# Altium footprint library Connectors_Old.PcbLib: 246 footprints (part 11 of 18)
Each footprint in its own frame and in the unit in brackets; x right, y up, seen from the top. Pads: shape width x height; smd on the part's side, far side on the other; paste and mask are expansions set on the pad; w line width, h text height; cw(c..) or ccw(c..) is an arc to the next point about the centre after c.
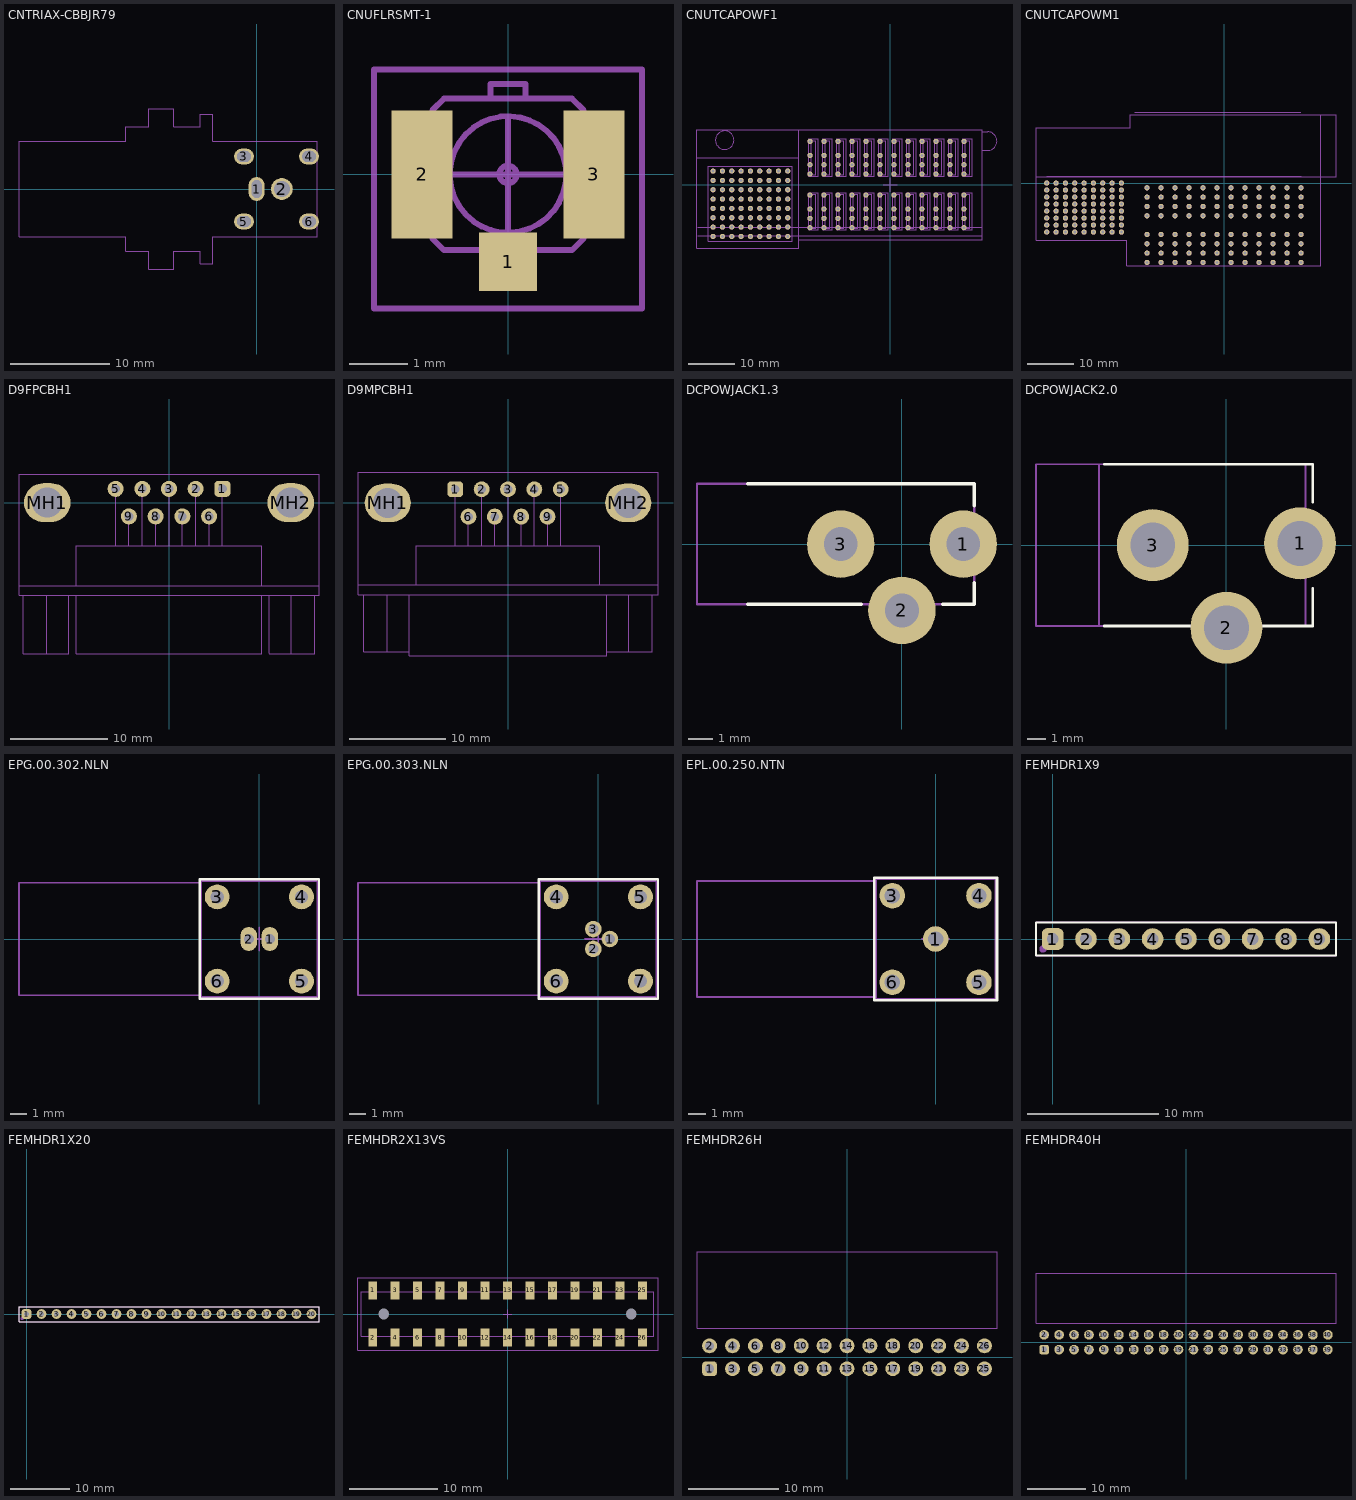
[diagram p10: the footprints below, top view; thin cyan lines are the x and y axes]

## CNTRIAX-CBBJR79 [mm] "Triax/Twinax Right Angle connector"
height 14.351
pads (6):
  oval 1.6x2.4 hole 1 slot 1.8 at 90 deg: 1(0,0)
  round 2.2 hole 1.6: 2(2.54,0)
  oval 2x1.6 hole 1.1 slot 1.4 at 0 deg: 3(-1.27,3.277) 4(5.283,3.277) 5(-1.27,-3.277) 6(5.283,-3.277)
Mechanical 13:
  lines w0.102: -23.927,-4.807 -23.927,4.807 -13.17,4.807 -13.17,6.25 -10.884,6.25 -10.884,8.1 -8.344,8.1 -8.344,6.25 -5.69,6.25 -5.69,7.54 -4.42,7.54 -4.42,4.805 6.096,4.805 6.096,-4.805 -4.42,-4.805 -4.42,-7.54 -5.69,-7.54 -5.69,-6.25 -8.344,-6.25 -8.344,-8.1 -10.884,-8.1 -10.884,-6.25 -13.17,-6.25 -13.17,-4.807 -23.927,-4.807
3D body: height 0.76, standoff 0, extent -2.032,-4.064 6.096,4.064
3D body: height 10.89, standoff 1.3, extent -4.42,-4.805 6.096,4.767
3D body: height 13.62, standoff -1.43, extent -5.69,-7.481 -4.42,7.54
3D body: height 12.33, standoff -0.14, extent -8.344,-6.25 -5.69,6.201
3D body: height 14.18, standoff -1.99, extent -10.884,-8.036 -8.344,8.1
3D body: height 12.33, standoff -0.14, extent -13.17,-6.201 -10.884,6.25
3D body: height 10.91, standoff 1.28, extent -23.927,-4.807 -13.17,4.807
3D body: height 0, standoff -3.3, extent -1.905,3.175 -0.635,3.81
3D body: height 0, standoff -3.3, extent 4.648,3.175 5.918,3.81
3D body: height 0, standoff -3.3, extent -1.905,-3.81 -0.635,-3.175
3D body: height 0, standoff -3.3, extent 4.648,-3.81 5.918,-3.175
3D body: height 0, standoff -3.3, extent -0.35,-0.7 0.35,0.7
3D body: height 0, standoff -3.6, extent 1.875,-0.722 3.269,0.675

## CNUFLRSMT-1 [mm] "ultra small RF connector 3x3.1mm"
height 2.4
pads (3):
  rect 1x1 smd: 1(0,-1.5)
  rect 1.05x2.2 smd: 2(-1.475,0) 3(1.475,0)
Mechanical 13:
  circle w0.1: c0,0 r1
  circle w0.1: c0,0 r0.15
  lines w0.102: -1.3,-0.9 -1.5,-0.9 -1.5,0.9 -1.3,0.9 ; -0.3,-1.3 -0.3,-1.55 0.3,-1.55 0.3,-1.3 ; -0.3,1.3 -0.3,1.55 0.3,1.55 0.3,1.3 ; 1.3,-0.9 1.5,-0.9 1.5,0.9 1.3,0.9 ; -1.3,-1.1 -1.3,1.1 -1.1,1.3 1.1,1.3 1.3,1.1 1.3,-1.1 1.1,-1.3 -1.1,-1.3 -1.3,-1.1
Mechanical 15:
  lines w0.1: -1,0 1,0 ; 0,-1 0,1 ; -2.3,-2.3 -2.3,1.8 2.3,1.8 2.3,-2.3 -2.3,-2.3
3D body: height 1.25, standoff 0.35, extent -1.009,-1.009 1.009,1.009
3D body: height 0.35, standoff 0, extent -1.3,-1.3 1.3,1.3

## CNUTCAPOWF1 [mm] "uTCA Power connector female for backplane"
pads (168):
  round 1.1 hole 0.6: A1(-22,-11.12) A2(-24,-11.12) A3(-26,-11.12) A4(-28,-11.12) A5(-30,-11.12) A6(-32,-11.12) A7(-34,-11.12) A8(-36,-11.12) A9(-38,-11.12) B1(-22,-9.12) B2(-24,-9.12) B3(-26,-9.12) B4(-28,-9.12) B5(-30,-9.12) B6(-32,-9.12) B7(-34,-9.12) B8(-36,-9.12) B9(-38,-9.12) C1(-22,-7.12) C2(-24,-7.12) C3(-26,-7.12) C4(-28,-7.12) C5(-30,-7.12) C6(-32,-7.12) C7(-34,-7.12) C8(-36,-7.12) C9(-38,-7.12) D1(-22,-5.12) D2(-24,-5.12) D3(-26,-5.12) D4(-28,-5.12) D5(-30,-5.12) D6(-32,-5.12) D7(-34,-5.12) D8(-36,-5.12) D9(-38,-5.12) E1(-22,-3.12) E2(-24,-3.12) E3(-26,-3.12) E4(-28,-3.12) E5(-30,-3.12) E6(-32,-3.12) E7(-34,-3.12) E8(-36,-3.12) E9(-38,-3.12) F1(-22,-1.12) F2(-24,-1.12) F3(-26,-1.12) F4(-28,-1.12) F5(-30,-1.12) F6(-32,-1.12) F7(-34,-1.12) F8(-36,-1.12) F9(-38,-1.12) G1(-22,0.88) G2(-24,0.88) G3(-26,0.88) G4(-28,0.88) G5(-30,0.88) G6(-32,0.88) G7(-34,0.88) G8(-36,0.88) G9(-38,0.88) H1(-22,2.88) H2(-24,2.88) H3(-26,2.88) H4(-28,2.88) H5(-30,2.88) H6(-32,2.88) H7(-34,2.88) H8(-36,2.88) H9(-38,2.88) P1(15.75,-9.25) P1(15.75,-7.25) P1(15.75,-5.25) P1(15.75,-2.25) P2(12.75,-9.25) P2(12.75,-7.25) P2(12.75,-5.25) P2(12.75,-2.25) P3(9.75,-9.25) P3(9.75,-7.25) P3(9.75,-5.25) P3(9.75,-2.25) P4(6.75,-9.25) P4(6.75,-7.25) P4(6.75,-5.25) P4(6.75,-2.25) P5(3.75,-9.25) P5(3.75,-7.25) P5(3.75,-5.25) P5(3.75,-2.25) P6(0.75,-9.25) P6(0.75,-7.25) P6(0.75,-5.25) P6(0.75,-2.25) P7(-2.25,-9.25) P7(-2.25,-7.25) P7(-2.25,-5.25) P7(-2.25,-2.25) P8(-5.25,-9.25) P8(-5.25,-7.25) P8(-5.25,-5.25) P8(-5.25,-2.25) P9(-8.25,-9.25) P9(-8.25,-7.25) P9(-8.25,-5.25) P9(-8.25,-2.25) P10(-11.25,-9.25) P10(-11.25,-7.25) P10(-11.25,-5.25) P10(-11.25,-2.25) P11(-14.25,-9.25) P11(-14.25,-7.25) P11(-14.25,-5.25) P11(-14.25,-2.25) P12(-17.25,-9.25) P12(-17.25,-7.25) P12(-17.25,-5.25) P12(-17.25,-2.25) P13(15.75,2.25) P13(15.75,4.25) P13(15.775,6.25) P13(15.775,9.25) P14(12.75,2.25) P14(12.75,4.25) P14(12.775,6.25) P14(12.775,9.25) P15(9.75,2.25) P15(9.75,4.25) P15(9.775,6.25) P15(9.775,9.25) P16(6.75,2.25) P16(6.75,4.25) P16(6.775,6.25) P16(6.775,9.25) P17(3.75,2.25) P17(3.75,4.25) P17(3.775,6.25) P17(3.775,9.25) P18(0.75,2.25) P18(0.75,4.25) P18(0.775,6.25) P18(0.775,9.25) P19(-2.25,2.25) P19(-2.25,4.25) P19(-2.225,6.25) P19(-2.225,9.25) P20(-5.25,2.25) P20(-5.25,4.25) P20(-5.225,6.25) P20(-5.225,9.25) P21(-8.25,2.25) P21(-8.25,4.25) P21(-8.225,6.25) P21(-8.225,9.25) P22(-11.25,2.25) P22(-11.25,4.25) P22(-11.225,6.25) P22(-11.225,9.25) P23(-14.25,2.25) P23(-14.25,4.25) P23(-14.225,6.25) P23(-14.225,9.25) P24(-17.25,2.25) P24(-17.25,4.25) P24(-17.225,6.25) P24(-17.225,9.25)
Mechanical 13:
  drawing of 208 lines, arcs and shapes, not listed
Mechanical 15:
  lines w0.1: -41.25,-11 19.5,-11 ; -41.25,-9.12 19.5,-9.12 ; -1.5,0 1.5,0 ; 0,-1.5 0,1.5
  text "EDGE DAUGHTER PCB" at -20.75,-10.52 h1
Mechanical 17:
  drawing of 168 lines, arcs and shapes, not listed
  text "Finished hole: 0.6 ± 0.05 mm" at -38.608,10.922 h2.5
  text "Drilled hole: 0.7 ± 0.02 mm" at -38.608,12.954 h2.5
3D body: height 10, standoff -3.7, extent -38.252,-11.333 -37.744,-10.901
3D body: height 10, standoff -3.7, extent -36.252,-11.333 -35.744,-10.901
3D body: height 10, standoff -3.7, extent -34.252,-11.333 -33.744,-10.901
3D body: height 10, standoff -3.7, extent -32.252,-11.333 -31.744,-10.901
3D body: height 10, standoff -3.7, extent -30.252,-11.333 -29.744,-10.901
3D body: height 10, standoff -3.7, extent -28.252,-11.333 -27.744,-10.901
3D body: height 10, standoff -3.7, extent -26.252,-11.333 -25.744,-10.901
3D body: height 10, standoff -3.7, extent -24.252,-11.333 -23.744,-10.901
3D body: height 10, standoff -3.7, extent -22.252,-11.333 -21.744,-10.901
3D body: height 10, standoff -3.7, extent -38.252,-9.333 -37.744,-8.901
3D body: height 10, standoff -3.7, extent -36.252,-9.333 -35.744,-8.901
3D body: height 10, standoff -3.7, extent -34.252,-9.333 -33.744,-8.901
3D body: height 10, standoff -3.7, extent -32.252,-9.333 -31.744,-8.901
3D body: height 10, standoff -3.7, extent -30.252,-9.333 -29.744,-8.901
3D body: height 10, standoff -3.7, extent -28.252,-9.333 -27.744,-8.901
3D body: height 10, standoff -3.7, extent -26.252,-9.333 -25.744,-8.901
3D body: height 10, standoff -3.7, extent -24.252,-9.333 -23.744,-8.901
3D body: height 10, standoff -3.7, extent -22.252,-9.333 -21.744,-8.901
3D body: height 10, standoff -3.7, extent -38.252,-7.333 -37.744,-6.901
3D body: height 10, standoff -3.7, extent -36.252,-7.333 -35.744,-6.901
3D body: height 10, standoff -3.7, extent -34.252,-7.333 -33.744,-6.901
3D body: height 10, standoff -3.7, extent -32.252,-7.333 -31.744,-6.901
3D body: height 10, standoff -3.7, extent -30.252,-7.333 -29.744,-6.901
3D body: height 10, standoff -3.7, extent -28.252,-7.333 -27.744,-6.901
3D body: height 10, standoff -3.7, extent -26.252,-7.333 -25.744,-6.901
3D body: height 10, standoff -3.7, extent -24.252,-7.333 -23.744,-6.901
3D body: height 10, standoff -3.7, extent -22.252,-7.333 -21.744,-6.901
3D body: height 10, standoff -3.7, extent -38.252,-5.333 -37.744,-4.901
3D body: height 10, standoff -3.7, extent -36.252,-5.333 -35.744,-4.901
3D body: height 10, standoff -3.7, extent -34.252,-5.333 -33.744,-4.901
3D body: height 10, standoff -3.7, extent -32.252,-5.333 -31.744,-4.901
3D body: height 10, standoff -3.7, extent -30.252,-5.333 -29.744,-4.901
3D body: height 10, standoff -3.7, extent -28.252,-5.333 -27.744,-4.901
3D body: height 10, standoff -3.7, extent -26.252,-5.333 -25.744,-4.901
3D body: height 10, standoff -3.7, extent -24.252,-5.333 -23.744,-4.901
3D body: height 10, standoff -3.7, extent -22.252,-5.333 -21.744,-4.901
3D body: height 10, standoff -3.7, extent -38.252,-5.333 -37.744,-4.901
3D body: height 10, standoff -3.7, extent -36.252,-5.333 -35.744,-4.901
3D body: height 10, standoff -3.7, extent -34.252,-5.333 -33.744,-4.901
3D body: height 10, standoff -3.7, extent -32.252,-5.333 -31.744,-4.901
3D body: height 10, standoff -3.7, extent -30.252,-5.333 -29.744,-4.901
3D body: height 10, standoff -3.7, extent -28.252,-5.333 -27.744,-4.901
3D body: height 10, standoff -3.7, extent -26.252,-5.333 -25.744,-4.901
3D body: height 10, standoff -3.7, extent -24.252,-5.333 -23.744,-4.901
3D body: height 10, standoff -3.7, extent -22.252,-5.333 -21.744,-4.901
3D body: height 10, standoff -3.7, extent -38.252,-3.333 -37.744,-2.901
3D body: height 10, standoff -3.7, extent -36.252,-3.333 -35.744,-2.901
3D body: height 10, standoff -3.7, extent -34.252,-3.333 -33.744,-2.901
3D body: height 10, standoff -3.7, extent -32.252,-3.333 -31.744,-2.901
3D body: height 10, standoff -3.7, extent -30.252,-3.333 -29.744,-2.901
3D body: height 10, standoff -3.7, extent -28.252,-3.333 -27.744,-2.901
3D body: height 10, standoff -3.7, extent -26.252,-3.333 -25.744,-2.901
3D body: height 10, standoff -3.7, extent -24.252,-3.333 -23.744,-2.901
3D body: height 10, standoff -3.7, extent -22.252,-3.333 -21.744,-2.901
3D body: height 10, standoff -3.7, extent -38.252,-1.333 -37.744,-0.901
3D body: height 10, standoff -3.7, extent -36.252,-1.333 -35.744,-0.901
3D body: height 10, standoff -3.7, extent -34.252,-1.333 -33.744,-0.901
3D body: height 10, standoff -3.7, extent -32.252,-1.333 -31.744,-0.901
3D body: height 10, standoff -3.7, extent -30.252,-1.333 -29.744,-0.901
3D body: height 10, standoff -3.7, extent -28.252,-1.333 -27.744,-0.901
3D body: height 10, standoff -3.7, extent -26.252,-1.333 -25.744,-0.901
3D body: height 10, standoff -3.7, extent -24.252,-1.333 -23.744,-0.901
3D body: height 10, standoff -3.7, extent -22.252,-1.333 -21.744,-0.901
3D body: height 10, standoff -3.7, extent -38.252,0.667 -37.744,1.099
3D body: height 10, standoff -3.7, extent -36.252,0.667 -35.744,1.099
3D body: height 10, standoff -3.7, extent -34.252,0.667 -33.744,1.099
3D body: height 10, standoff -3.7, extent -32.252,0.667 -31.744,1.099
3D body: height 10, standoff -3.7, extent -30.252,0.667 -29.744,1.099
3D body: height 10, standoff -3.7, extent -28.252,0.667 -27.744,1.099
3D body: height 10, standoff -3.7, extent -26.252,0.667 -25.744,1.099
3D body: height 10, standoff -3.7, extent -24.252,0.667 -23.744,1.099
3D body: height 10, standoff -3.7, extent -22.252,0.667 -21.744,1.099
3D body: height 10, standoff -3.7, extent -22.252,2.667 -21.744,3.099
3D body: height 10, standoff -3.7, extent -24.252,2.667 -23.744,3.099
3D body: height 10, standoff -3.7, extent -26.252,2.667 -25.744,3.099
3D body: height 10, standoff -3.7, extent -28.252,2.667 -27.744,3.099
3D body: height 10, standoff -3.7, extent -30.252,2.667 -29.744,3.099
3D body: height 10, standoff -3.7, extent -32.252,2.667 -31.744,3.099
3D body: height 10, standoff -3.7, extent -34.252,2.667 -33.744,3.099
3D body: height 10, standoff -3.7, extent -36.252,2.667 -35.744,3.099
3D body: height 10, standoff -3.7, extent -38.252,2.667 -37.744,3.099
3D body: height 17, standoff 0, extent -37.5,7.48 -33.51,11.48
3D body: height 12.5, standoff 0, extent -19.65,-11.87 19.65,11.78
3D body: height 3.5, standoff 0, extent -41.45,5.755 -19.65,11.78
3D body: height 13, standoff 0, extent -41.45,-13.695 -19.65,5.755
3D body: height 3, standoff 0, extent -39,-12.12 -21,3.88
3D body: height 17, standoff 0, extent 19.65,7.305 22.8,11.285
3D body: height 12.51, standoff 12.5, extent -16.95,2.13 -16.05,9.43
3D body: height 12.51, standoff 12.5, extent -13.95,2.13 -13.05,9.43
3D body: height 12.51, standoff 12.5, extent -10.95,2.13 -10.05,9.43
3D body: height 12.51, standoff 12.5, extent -7.95,2.13 -7.05,9.43
3D body: height 12.51, standoff 12.5, extent -4.95,2.13 -4.05,9.43
3D body: height 12.51, standoff 12.5, extent -1.95,2.13 -1.05,9.43
3D body: height 12.51, standoff 12.5, extent 1.05,2.13 1.95,9.43
3D body: height 12.51, standoff 12.5, extent 4.05,2.13 4.95,9.43
3D body: height 12.51, standoff 12.5, extent 7.05,2.13 7.95,9.43
3D body: height 12.51, standoff 12.5, extent 10.05,2.13 10.95,9.43
3D body: height 12.51, standoff 12.5, extent 13.05,2.13 13.95,9.43
3D body: height 12.51, standoff 12.5, extent 16.05,2.13 16.95,9.43
3D body: height 12.51, standoff 12.5, extent -16.95,-9.37 -16.05,-2.07
3D body: height 12.51, standoff 12.5, extent -13.95,-9.37 -13.05,-2.07
3D body: height 12.51, standoff 12.5, extent -10.95,-9.37 -10.05,-2.07
3D body: height 12.51, standoff 12.5, extent -7.95,-9.37 -7.05,-2.07
3D body: height 12.51, standoff 12.5, extent -4.95,-9.37 -4.05,-2.07
3D body: height 12.51, standoff 12.5, extent -1.95,-9.37 -1.05,-2.07
3D body: height 12.51, standoff 12.5, extent 1.05,-9.37 1.95,-2.07
3D body: height 12.51, standoff 12.5, extent 4.05,-9.37 4.95,-2.07
3D body: height 12.51, standoff 12.5, extent 7.068,-9.37 7.968,-2.07
3D body: height 12.51, standoff 12.5, extent 10.05,-9.37 10.95,-2.07
3D body: height 12.51, standoff 12.5, extent 13.05,-9.37 13.95,-2.07
3D body: height 12.51, standoff 12.5, extent 16.05,-9.37 16.95,-2.07

## CNUTCAPOWM1 [mm] "uTCA Power connector male for board"
pads (168):
  round 1.1 hole 0.6: A1(-22,0) A2(-24,0) A3(-26,0) A4(-28,0) A5(-30,0) A6(-32,0) A7(-34,0) A8(-36,0) A9(-38,0) B1(-22,-1.5) B2(-24,-1.5) B3(-26,-1.5) B4(-28,-1.5) B5(-30,-1.5) B6(-32,-1.5) B7(-34,-1.5) B8(-36,-1.5) B9(-38,-1.5) C1(-22,-3) C2(-24,-3) C3(-26,-3) C4(-28,-3) C5(-30,-3) C6(-32,-3) C7(-34,-3) C8(-36,-3) C9(-38,-3) D1(-22,-4.5) D2(-24,-4.5) D3(-26,-4.5) D4(-28,-4.5) D5(-30,-4.5) D6(-32,-4.5) D7(-34,-4.5) D8(-36,-4.5) D9(-38,-4.5) E1(-22,-6) E2(-24,-6) E3(-26,-6) E4(-28,-6) E5(-30,-6) E6(-32,-6) E7(-34,-6) E8(-36,-6) E9(-38,-6) F1(-22,-7.5) F2(-24,-7.5) F3(-26,-7.5) F4(-28,-7.5) F5(-30,-7.5) F6(-32,-7.5) F7(-34,-7.5) F8(-36,-7.5) F9(-38,-7.5) G1(-22,-9) G2(-24,-9) G3(-26,-9) G4(-28,-9) G5(-30,-9) G6(-32,-9) G7(-34,-9) G8(-36,-9) G9(-38,-9) H1(-22,-10.5) H2(-24,-10.5) H3(-26,-10.5) H4(-28,-10.5) H5(-30,-10.5) H6(-32,-10.5) H7(-34,-10.5) H8(-36,-10.5) H9(-38,-10.5) P1(16.5,-7) P1(16.5,-5) P1(16.5,-3) P1(16.5,-1) P2(13.5,-7) P2(13.5,-5) P2(13.5,-3) P2(13.5,-1) P3(10.5,-7) P3(10.5,-5) P3(10.5,-3) P3(10.5,-1) P4(7.5,-7) P4(7.5,-5) P4(7.5,-3) P4(7.5,-1) P5(4.5,-7) P5(4.5,-5) P5(4.5,-3) P5(4.5,-1) P6(1.5,-7) P6(1.5,-5) P6(1.5,-3) P6(1.5,-1) P7(-1.5,-7) P7(-1.5,-5) P7(-1.5,-3) P7(-1.5,-1) P8(-4.5,-7) P8(-4.5,-5) P8(-4.5,-3) P8(-4.5,-1) P9(-7.5,-7) P9(-7.5,-5) P9(-7.5,-3) P9(-7.5,-1) P10(-10.5,-7) P10(-10.5,-5) P10(-10.5,-3) P10(-10.5,-1) P11(-13.5,-7) P11(-13.5,-5) P11(-13.5,-3) P11(-13.5,-1) P12(-16.5,-7) P12(-16.5,-5) P12(-16.5,-3) P12(-16.5,-1) P13(16.5,-17) P13(16.5,-15) P13(16.5,-13) P13(16.5,-11) P14(13.5,-17) P14(13.5,-15) P14(13.5,-13) P14(13.5,-11) P15(10.5,-17) P15(10.5,-15) P15(10.5,-13) P15(10.5,-11) P16(7.5,-17) P16(7.5,-15) P16(7.5,-13) P16(7.5,-11) P17(4.5,-17) P17(4.5,-15) P17(4.5,-13) P17(4.5,-11) P18(1.5,-17) P18(1.5,-15) P18(1.5,-13) P18(1.5,-11) P19(-1.5,-17) P19(-1.5,-15) P19(-1.5,-13) P19(-1.5,-11) P20(-4.5,-17) P20(-4.5,-15) P20(-4.5,-13) P20(-4.5,-11) P21(-7.5,-17) P21(-7.5,-15) P21(-7.5,-13) P21(-7.5,-11) P22(-10.5,-17) P22(-10.5,-15) P22(-10.5,-13) P22(-10.5,-11) P23(-13.5,-17) P23(-13.5,-15) P23(-13.5,-13) P23(-13.5,-11) P24(-16.5,-17) P24(-16.5,-15) P24(-16.5,-13) P24(-16.5,-11)
Mechanical 13:
  lines w0.127: -40.3,1.325 20.7,1.325 24,1.325 24,14.675 20.7,14.675 ; 20.7,14.675 20.7,-17.675 -20.8,-17.675 -20.8,-12.3 -40.3,-12.3 -40.3,11.825 -20.1,11.825 -20.1,14.675 20.7,14.675
Mechanical 15:
  lines w0.127: -38,1.5 16.5,1.5 ; -19.1,15.15 16.475,15.15
  text "BACKPLANE" at -3.6,13.925 h0.8
  text "BOARD LINE" at -13.1,0.4 h0.8
Mechanical 17:
  drawing of 168 lines, arcs and shapes, not listed
  text "Drilled hole: 0.7 ± 0.02 mm" at -38.608,-19.812 h2.5
  text "Finished hole: 0.6 ± 0.05 mm" at -38.608,-21.971 h2.5

## D9FPCBH1 [mm] "Dsub 9pin female PCB horizontal"
height 11.2
pads (11):
  rrect50% 1.651x1.651 hole 0.9 paste-1.27: 1(5.48,1.42)
  round 1.651 hole 0.9 paste-1.27: 2(2.74,1.42) 3(0,1.42) 4(-2.74,1.42) 5(-5.48,1.42) 6(4.11,-1.42) 7(1.37,-1.42) 8(-1.37,-1.42) 9(-4.11,-1.42)
  oval 4.8x4 hole 3.1: MH1(-12.497,0) MH2(12.497,0)
Mechanical 13:
  circle w0.102: c-12.497,-0.025 r1.55
  circle w0.102: c12.497,-0.025 r1.55
  circle w0.65: c-5.48,1.42 r0.35
  circle w0.65: c-2.74,1.42 r0.35
  circle w0.65: c0,1.42 r0.35
  circle w0.65: c2.74,1.42 r0.35
  circle w0.65: c5.48,1.42 r0.35
  circle w0.65: c4.11,-1.42 r0.35
  circle w0.65: c1.37,-1.42 r0.35
  circle w0.65: c-1.37,-1.42 r0.35
  circle w0.65: c-4.11,-1.42 r0.35
  lines w0.102: -15.4,-8.509 15.4,-8.509 ; -14.986,-9.525 -14.986,-15.494 -10.287,-15.494 -10.287,-9.538 -10.3,-9.525 ; -12.573,-15.494 -12.573,-9.525 ; -9.525,-8.509 -9.525,-4.445 9.525,-4.445 9.525,-8.509 ; -9.5,-9.525 -9.5,-15.5 9.525,-15.5 9.525,-9.525 ; -5.461,-4.445 -5.461,1.397 ; -4.11,-4.445 -4.11,-1.42 ; -2.74,-4.445 -2.74,1.42 ; -1.37,-4.445 -1.37,-1.42 ; 0,-4.445 0,1.42 ; 1.37,-4.445 1.37,-1.42 ; 2.74,-4.445 2.74,1.42 ; 4.11,-4.445 4.11,-1.42 ; 5.48,-4.445 5.48,1.42 ; 10.262,-9.525 10.287,-9.55 10.287,-15.469 ; 10.287,-15.494 14.986,-15.494 14.986,-9.525 ; 12.573,-15.494 12.573,-9.525 ; -15.4,-9.525 15.4,-9.525 15.4,2.9 -15.4,2.9 -15.4,-9.525
3D body: height 12.52, standoff -4.08, extent -15.4,-15.524 15.4,2.896

## D9MPCBH1 [mm] "Dsub 9pin male PCB horizontal"
height 11.2
pads (11):
  rrect50% 1.651x1.651 hole 0.9 paste-1.27: 1(-5.48,1.42)
  round 1.651 hole 0.9 paste-1.27: 2(-2.74,1.42) 3(0,1.42) 4(2.74,1.42) 5(5.48,1.42) 6(-4.11,-1.42) 7(-1.37,-1.42) 8(1.37,-1.42) 9(4.11,-1.42)
  oval 4.8x4 hole 3.1: MH1(-12.497,0) MH2(12.497,0)
Mechanical 13:
  circle w0.102: c-12.497,-0.025 r1.55
  circle w0.102: c12.497,-0.025 r1.55
  circle w0.65: c-5.48,1.42 r0.35
  circle w0.65: c-2.74,1.42 r0.35
  circle w0.65: c0,1.42 r0.35
  circle w0.65: c2.74,1.42 r0.35
  circle w0.65: c5.48,1.42 r0.35
  circle w0.65: c4.11,-1.42 r0.35
  circle w0.65: c1.37,-1.42 r0.35
  circle w0.65: c-1.37,-1.42 r0.35
  circle w0.65: c-4.11,-1.42 r0.35
  lines w0.102: -15.596,-8.509 15.596,-8.509 ; -14.986,-9.525 -14.986,-15.494 -10.287,-15.494 ; -12.573,-15.494 -12.573,-9.525 ; -10.3,-9.525 -10.287,-9.538 -10.287,-15.875 10.287,-15.875 10.287,-9.55 10.262,-9.525 ; -9.525,-8.509 -9.525,-4.445 9.525,-4.445 9.525,-8.509 ; -5.461,-4.445 -5.461,1.397 ; -4.11,-4.445 -4.11,-1.42 ; -2.74,-4.445 -2.74,1.42 ; -1.37,-4.445 -1.37,-1.42 ; 0,-4.445 0,1.42 ; 1.37,-4.445 1.37,-1.42 ; 2.74,-4.445 2.74,1.42 ; 4.11,-4.445 4.11,-1.42 ; 5.48,-4.445 5.48,1.42 ; 10.287,-15.494 14.986,-15.494 14.986,-9.525 ; 12.573,-15.494 12.573,-9.525 ; -15.596,-9.525 15.596,-9.525 15.596,3.175 -15.596,3.175 -15.596,-9.525
3D body: height 11.2, standoff 0, extent -15.596,-9.525 15.596,-8.509
3D body: height 9, standoff 3, extent -9.525,-8.509 9.525,-4.445
3D body: height 3, standoff 0, extent -15.596,-8.509 15.596,3.175
3D body: height 9, standoff 2, extent -10.308,-15.875 10.293,-9.525
3D body: height 8, standoff 4, extent -14.986,-15.494 -10.287,-9.525
3D body: height 8, standoff 4, extent 10.262,-15.494 14.986,-9.525
3D body: height 7, standoff -3.2, extent -5.943,0.968 -5.051,1.86
3D body: height 7, standoff -3.2, extent -3.203,0.968 -2.311,1.86
3D body: height 7, standoff -3.2, extent -0.463,0.968 0.429,1.86
3D body: height 7, standoff -3.2, extent 2.277,0.968 3.169,1.86
3D body: height 7, standoff -3.2, extent 5.017,0.968 5.909,1.86
3D body: height 5, standoff -3.2, extent -4.573,-1.872 -3.681,-0.98
3D body: height 5, standoff -3.2, extent -1.833,-1.872 -0.941,-0.98
3D body: height 5, standoff -3.2, extent 0.907,-1.872 1.799,-0.98
3D body: height 5, standoff -3.2, extent 3.647,-1.872 4.539,-0.98
3D body: height 6, standoff 5, extent -4.575,-4.445 -3.65,-0.975
3D body: height 6, standoff 5, extent -1.835,-4.445 -0.91,-0.975
3D body: height 6, standoff 5, extent 0.905,-4.445 1.83,-0.975
3D body: height 6, standoff 5, extent 3.645,-4.445 4.57,-0.975
3D body: height 8, standoff 7, extent -5.945,-4.445 -5.02,1.865
3D body: height 8, standoff 7, extent -3.205,-4.445 -2.28,1.865
3D body: height 8, standoff 7, extent -0.465,-4.445 0.46,1.865
3D body: height 8, standoff 7, extent 2.275,-4.445 3.2,1.865
3D body: height 8, standoff 7, extent 5.015,-4.445 5.94,1.865

## DCPOWJACK1.3 [mm] "DC POWER JACK 11.5x5x7.5x1.3mm"
height 7.5
pads (3):
  round 2.8 hole 1.4: 1(2.54,0) 2(0,-2.75) 3(-2.54,0)
Top Overlay:
  lines w0.15: -6.4,-2.5 -1.7,-2.5 ; -6.4,2.5 3,2.5 3,1.6 ; 1.7,-2.5 3,-2.5 3,-1.6
Mechanical 13:
  lines w0.102: -8.5,-2.5 -8.5,2.5 3,2.5 3,-2.5 -8.5,-2.5
3D body: height 7.5, standoff 0, extent -8.5,-2.5 3,2.5

## DCPOWJACK2.0 [mm] "DC POWER JACK 9X11X15 6.5X2mm"
height 11
pads (3):
  round 4 hole 2.5: 1(4.1,0.1) 2(0,-4.6) 3(-4.1,0)
Top Overlay:
  lines w0.15: -6.8,-4.5 4.8,-4.5 4.8,-2.4 ; -6.8,4.5 4.8,4.5 4.8,2.4
Mechanical 13:
  lines w0.102: -7.1,-4.5 -7.1,4.5 ; -10.6,-4.5 -10.6,4.5 4.4,4.5 4.4,-4.5 -10.6,-4.5
3D body: height 3, standoff -3.5, extent -4.25,-1.194 -3.92,1.143
3D body: height 3, standoff -3.5, extent 4.392,-1.143 4.722,1.194
3D body: height 3, standoff -3.5, extent -1.143,-4.75 1.194,-4.42
3D body: height 7.3, standoff 5.3, extent -10.69,-0.976 -8.69,1.016
3D body: height 9.44, standoff 3.16, extent -10.668,-3.138 -8.668,3.138
3D body: height 11, standoff 0, extent -10.6,-4.5 4.4,4.5

## EPG.00.302.NLN [mm] "Lemo 2 pin PCB horizontal"
height 7
pads (6):
  oval 1x1.45 hole 0.6: 1(0.635,0) 2(-0.635,0)
  round 1.5 hole 0.8: 3(-2.54,2.54) 4(2.54,2.54) 5(2.54,-2.54) 6(-2.54,-2.54)
Top Overlay:
  lines w0.15: -3.6,-3.6 -3.6,3.6 3.6,3.6 3.6,-3.6 -3.6,-3.6
Mechanical 13:
  lines w0.102: -3.5,-3.4 -14.5,-3.4 -14.5,3.4 -3.5,3.4 ; -3.5,-3.5 3.5,-3.5 3.5,3.5 -3.5,3.5 -3.5,-3.5
Mechanical 15:
  lines w0.102: -0.8,0 0.8,0 ; 0,-0.7 0,0.7
3D body: height 6.87, standoff 0.1, extent -14.5,-3.4 -3.5,3.387
3D body: height 7, standoff 0, extent -3.5,-3.5 3.5,3.5

## EPG.00.303.NLN [mm] "Lemo 3 pin PCB horizontal"
height 7
pads (7):
  round 1 hole 0.6: 1(0.7,0) 2(-0.3,-0.6) 3(-0.3,0.6)
  round 1.5 hole 0.8: 4(-2.54,2.54) 5(2.54,2.54) 6(-2.54,-2.54) 7(2.54,-2.54)
Top Overlay:
  lines w0.15: -3.6,-3.6 -3.6,3.6 3.6,3.6 3.6,-3.6 -3.6,-3.6
Mechanical 13:
  lines w0.102: -3.5,-3.4 -14.5,-3.4 -14.5,3.4 -3.5,3.4 ; -3.5,-3.5 3.5,-3.5 3.5,3.5 -3.5,3.5 -3.5,-3.5
Mechanical 15:
  lines w0.102: -0.8,0 0.8,0 ; 0,-0.7 0,0.7
3D body: height 7, standoff 0, extent -3.5,-3.5 3.5,3.5
3D body: height 6.87, standoff 0.1, extent -14.5,-3.4 -3.5,3.387

## EPL.00.250.NTN [mm] "Lemo 1 pin PCB horizontal"
height 7
pads (5):
  round 1.5 hole 0.9: 1(0,0) 3(-2.54,2.54) 4(2.54,2.54) 5(2.54,-2.54) 6(-2.54,-2.54)
Top Overlay:
  lines w0.15: -3.6,-3.6 -3.6,3.6 3.6,3.6 3.6,-3.6 -3.6,-3.6
Mechanical 13:
  lines w0.102: -3.5,-3.4 -14,-3.4 -14,3.4 -3.5,3.4 ; -3.5,-3.5 3.5,-3.5 3.5,3.5 -3.5,3.5 -3.5,-3.5
Mechanical 15:
  lines w0.102: -0.8,0 0.8,0 ; 0,-0.7 0,0.7
3D body: height 7.02, standoff -2.98, extent -14,-3.5 3.5,3.5

## FEMHDR1X9 [mil]
pads (9):
  rrect50% 65x65 hole 35.43 paste-50: 1(0,0)
  round 65 hole 35.43 paste-50: 2(100,0) 3(200,0)
  round 65 hole 35.43: 4(300,0) 5(400,0) 6(500,0) 7(600,0) 8(700,0) 9(800,0)
Top Overlay:
  lines w5.91: -50,-50 850,-50 850,50 -50,50 -50,-50
Mechanical 13:
  circle w10: c-29,-30 r6
  lines w4: -50,-50 850,-50 850,50 -50,50 -50,-50
3D body: height 100, standoff 0, extent -50,-50 850,50

## FEMHDR1X20 [mil]
pads (20):
  rrect50% 65x65 hole 35.43 paste-50: 1(0,0)
  round 65 hole 35.43 paste-50: 2(100,0) 3(200,0)
  round 65 hole 35.43: 4(300,0) 5(400,0) 6(500,0) 7(600,0) 8(700,0) 9(800,0) 10(900,0) 11(1000,0) 12(1100,0) 13(1200,0) 14(1300,0) 15(1400,0) 16(1500,0) 17(1600,0) 18(1700,0) 19(1800,0) 20(1900,0)
Top Overlay:
  lines w5.91: -50,-50 -50,50 1950,50 1950,-50 -50,-50
Mechanical 13:
  circle w10: c-29,-30 r6
  lines w4: -50,-50 -50,50 1950,50 1950,-50 -50,-50
3D body: height 100, standoff 0, extent -50,-50 1950,50

## FEMHDR2X13VS [mm] "Connector IDC Low Profile Female Header, SMD; 26 pin; Vertical; R2.54 mm"
height 7.5
pads (28):
  rect 1x2.03 smd: 1(-15.24,2.67) 2(-15.24,-2.67) 3(-12.7,2.67) 4(-12.7,-2.67) 5(-10.16,2.67) 6(-10.16,-2.67) 7(-7.62,2.67) 8(-7.62,-2.67) 9(-5.08,2.67) 10(-5.08,-2.67) 11(-2.54,2.67) 12(-2.54,-2.67) 13(0,2.67) 14(0,-2.67) 15(2.54,2.67) 16(2.54,-2.67) 17(5.08,2.67) 18(5.08,-2.67) 19(7.62,2.67) 20(7.62,-2.67) 21(10.16,2.67) 22(10.16,-2.67) 23(12.7,2.67) 24(12.7,-2.67) 25(15.24,2.67) 26(15.24,-2.67)
  rect 0x0 hole 1.2: MH1(-13.97,0) MH2(13.97,0)
Mechanical 13:
  lines w0.102: -16.51,-2.5 16.51,-2.5 16.51,2.5 -16.51,2.5 -16.51,-2.5
  text "2" at -15.697,-1.981 h1.5
  text "1" at -15.418,0.584 h1.5
  text "25" at 13.818,0.559 h1.5
  text "26" at 13.792,-1.981 h1.5
Mechanical 15:
  lines w0.102: -0.5,0 0.5,0 ; 0,-0.5 0,0.5 ; -16.9,-4.1 -16.9,4.1 17,4.1 17,-4.1 -16.9,-4.1
3D body: height 7.5, standoff 0.4, extent -16.51,-2.5 16.51,2.5

## FEMHDR26H [mm] "Connector IDC Low Profile Female Header, Thru-Hole; 26 pin; Horizontal; R2.54 mm"
height 5
pads (26):
  rrect50% 1.65x1.65 hole 1: 1(-15.24,-1.27)
  round 1.65 hole 1: 2(-15.24,1.27) 3(-12.7,-1.27) 4(-12.7,1.27) 5(-10.16,-1.27) 6(-10.16,1.27) 7(-7.62,-1.27) 8(-7.62,1.27) 9(-5.08,-1.27) 10(-5.08,1.27) 11(-2.54,-1.27) 12(-2.54,1.27) 13(0,-1.27) 14(0,1.27) 15(2.54,-1.27) 16(2.54,1.27) 17(5.08,-1.27) 18(5.08,1.27) 19(7.62,-1.27) 20(7.62,1.27) 21(10.16,-1.27) 22(10.16,1.27) 23(12.7,-1.27) 24(12.7,1.27) 25(15.24,-1.27) 26(15.24,1.27)
Mechanical 13:
  lines w0.127: -16.635,11.7 16.635,11.7 16.635,3.2 -16.635,3.2 -16.635,11.675 -16.61,11.7
  text "26" at 16.44,0.52 h1.5
  text "25" at 16.44,-2.02 h1.5
  text "1" at -16.94,-2.02 h1.5
  text "2" at -17.44,0.52 h1.5
3D body: height 4.5, standoff 4, extent 14.77,-1.765 15.72,3.9
3D body: height 4.5, standoff 4, extent 12.23,-1.765 13.18,3.9
3D body: height 4.5, standoff 4, extent 9.69,-1.765 10.64,3.9
3D body: height 4.5, standoff 4, extent 7.15,-1.765 8.1,3.9
3D body: height 4.5, standoff 4, extent 4.61,-1.765 5.56,3.9
3D body: height 4.5, standoff 4, extent 2.07,-1.765 3.02,3.9
3D body: height 4.5, standoff 4, extent -0.47,-1.765 0.48,3.9
3D body: height 4.5, standoff 4, extent -3.01,-1.765 -2.06,3.9
3D body: height 4.5, standoff 4, extent -5.55,-1.765 -4.6,3.9
3D body: height 4.5, standoff 4, extent -8.09,-1.765 -7.14,3.9
3D body: height 4.5, standoff 4, extent -10.63,-1.765 -9.68,3.9
3D body: height 4.5, standoff 4, extent -13.17,-1.765 -12.22,3.9
3D body: height 4.5, standoff 4, extent -15.71,-1.765 -14.76,3.9
3D body: height 2.5, standoff 2, extent 14.77,0.775 15.72,3.9
3D body: height 2.5, standoff 2, extent 12.23,0.775 13.18,3.9
3D body: height 2.5, standoff 2, extent 9.69,0.775 10.64,3.9
3D body: height 2.5, standoff 2, extent 7.15,0.775 8.1,3.9
3D body: height 2.5, standoff 2, extent 4.61,0.775 5.56,3.9
3D body: height 2.5, standoff 2, extent 2.07,0.775 3.02,3.9
3D body: height 2.5, standoff 2, extent -0.47,0.775 0.48,3.9
3D body: height 2.5, standoff 2, extent -3.01,0.775 -2.06,3.9
3D body: height 2.5, standoff 2, extent -5.55,0.775 -4.6,3.9
3D body: height 2.5, standoff 2, extent -8.09,0.775 -7.14,3.9
3D body: height 2.5, standoff 2, extent -10.63,0.775 -9.68,3.9
3D body: height 2.5, standoff 2, extent -13.17,0.775 -12.22,3.9
3D body: height 2.5, standoff 2, extent -15.71,0.775 -14.76,3.9
3D body: height 4, standoff -3, extent -15.61,-1.6 -14.91,-0.9
3D body: height 4, standoff -3, extent -13.07,-1.6 -12.37,-0.9
3D body: height 4, standoff -3, extent -10.53,-1.6 -9.83,-0.9
3D body: height 4, standoff -3, extent -7.99,-1.6 -7.29,-0.9
3D body: height 4, standoff -3, extent -5.45,-1.6 -4.75,-0.9
3D body: height 4, standoff -3, extent -2.91,-1.6 -2.21,-0.9
3D body: height 4, standoff -3, extent -0.37,-1.6 0.33,-0.9
3D body: height 4, standoff -3, extent -0.37,-1.6 0.33,-0.9
3D body: height 4, standoff -3, extent 2.17,-1.6 2.87,-0.9
3D body: height 4, standoff -3, extent 4.71,-1.6 5.41,-0.9
3D body: height 4, standoff -3, extent 7.25,-1.6 7.95,-0.9
3D body: height 4, standoff -3, extent 9.79,-1.6 10.49,-0.9
3D body: height 4, standoff -3, extent 12.33,-1.6 13.03,-0.9
3D body: height 4, standoff -3, extent 14.87,-1.6 15.57,-0.9
3D body: height 2, standoff -3, extent -15.61,0.94 -14.91,1.64
3D body: height 2, standoff -3, extent -13.07,0.94 -12.37,1.64
3D body: height 2, standoff -3, extent -10.53,0.94 -9.83,1.64
3D body: height 2, standoff -3, extent -7.99,0.94 -7.29,1.64
3D body: height 2, standoff -3, extent -5.45,0.94 -4.75,1.64
3D body: height 2, standoff -3, extent -2.91,0.94 -2.21,1.64
3D body: height 2, standoff -3, extent -0.37,0.94 0.33,1.64
3D body: height 2, standoff -3, extent 2.17,0.94 2.87,1.64
3D body: height 2, standoff -3, extent 4.71,0.94 5.41,1.64
3D body: height 2, standoff -3, extent 7.25,0.94 7.95,1.64
3D body: height 2, standoff -3, extent 9.79,0.94 10.49,1.64
3D body: height 2, standoff -3, extent 12.33,0.94 13.03,1.64
3D body: height 2, standoff -3, extent 14.87,0.94 15.57,1.64
3D body: height 5, standoff 0, extent -16.61,3.2 16.637,11.7

## FEMHDR40H [mm] "Connector IDC Low Profile Female Header, Thru-Hole; 40 pin; Horizontal; R2.54 mm; Body 51.05 x 11.65 x 5 mm (LxWxH)"
height 5
pads (40):
  rrect50% 1.65x1.65 hole 1: 1(-24.13,-1.27)
  round 1.65 hole 1: 2(-24.13,1.27) 3(-21.59,-1.27) 4(-21.59,1.27) 5(-19.05,-1.27) 6(-19.05,1.27) 7(-16.51,-1.27) 8(-16.51,1.27) 9(-13.97,-1.27) 10(-13.97,1.27) 11(-11.43,-1.27) 12(-11.43,1.27) 13(-8.89,-1.27) 14(-8.89,1.27) 15(-6.35,-1.27) 16(-6.35,1.27) 17(-3.81,-1.27) 18(-3.81,1.27) 19(-1.27,-1.27) 20(-1.27,1.27) 21(1.27,-1.27) 22(1.27,1.27) 23(3.81,-1.27) 24(3.81,1.27) 25(6.35,-1.27) 26(6.35,1.27) 27(8.89,-1.27) 28(8.89,1.27) 29(11.43,-1.27) 30(11.43,1.27) 31(13.97,-1.27) 32(13.97,1.27) 33(16.51,-1.27) 34(16.51,1.27) 35(19.05,-1.27) 36(19.05,1.27) 37(21.59,-1.27) 38(21.59,1.27) 39(24.13,-1.27) 40(24.13,1.27)
Mechanical 13:
  lines w0.127: -25.525,3.2 -25.525,11.675 -25.5,11.7 25.525,11.7 25.525,3.2 -25.525,3.2
  text "40" at 25.33,0.52 h1.5
  text "39" at 25.33,-2.02 h1.5
  text "1" at -25.83,-2.02 h1.5
  text "2" at -26.33,0.52 h1.5
3D body: height 5, standoff 0, extent -25.5,3.2 25.525,11.7
3D body: height 2, standoff -3, extent 23.76,0.94 24.46,1.64
3D body: height 2, standoff -3, extent 21.22,0.94 21.92,1.64
3D body: height 2, standoff -3, extent 18.68,0.94 19.38,1.64
3D body: height 2, standoff -3, extent 16.14,0.94 16.84,1.64
3D body: height 2, standoff -3, extent 13.6,0.94 14.3,1.64
3D body: height 2, standoff -3, extent 11.06,0.94 11.76,1.64
3D body: height 2, standoff -3, extent 8.52,0.94 9.22,1.64
3D body: height 2, standoff -3, extent 5.98,0.94 6.68,1.64
3D body: height 2, standoff -3, extent 3.44,0.94 4.14,1.64
3D body: height 2, standoff -3, extent 0.9,0.94 1.6,1.64
3D body: height 2, standoff -3, extent -1.64,0.94 -0.94,1.64
3D body: height 2, standoff -3, extent -4.18,0.94 -3.48,1.64
3D body: height 2, standoff -3, extent -6.72,0.94 -6.02,1.64
3D body: height 2, standoff -3, extent -9.26,0.94 -8.56,1.64
3D body: height 2, standoff -3, extent -11.8,0.94 -11.1,1.64
3D body: height 2, standoff -3, extent -14.34,0.94 -13.64,1.64
3D body: height 2, standoff -3, extent -16.88,0.94 -16.18,1.64
3D body: height 2, standoff -3, extent -19.42,0.94 -18.72,1.64
3D body: height 2, standoff -3, extent -21.96,0.94 -21.26,1.64
3D body: height 2, standoff -3, extent -24.5,0.94 -23.8,1.64
3D body: height 4, standoff -3, extent 8.52,-1.6 9.22,-0.9
3D body: height 4, standoff -3, extent 5.98,-1.6 6.68,-0.9
3D body: height 4, standoff -3, extent 3.44,-1.6 4.14,-0.9
3D body: height 4, standoff -3, extent 0.9,-1.6 1.6,-0.9
3D body: height 4, standoff -3, extent -1.64,-1.6 -0.94,-0.9
3D body: height 4, standoff -3, extent -1.64,-1.6 -0.94,-0.9
3D body: height 4, standoff -3, extent -4.18,-1.6 -3.48,-0.9
3D body: height 4, standoff -3, extent -6.72,-1.6 -6.02,-0.9
3D body: height 4, standoff -3, extent -9.26,-1.6 -8.56,-0.9
3D body: height 4, standoff -3, extent -9.26,-1.6 -8.56,-0.9
3D body: height 4, standoff -3, extent -11.8,-1.6 -11.1,-0.9
3D body: height 4, standoff -3, extent -14.34,-1.6 -13.64,-0.9
3D body: height 4, standoff -3, extent -16.88,-1.6 -16.18,-0.9
3D body: height 4, standoff -3, extent -19.42,-1.6 -18.72,-0.9
3D body: height 4, standoff -3, extent -21.96,-1.6 -21.26,-0.9
3D body: height 4, standoff -3, extent -24.5,-1.6 -23.8,-0.9
3D body: height 2.5, standoff 2, extent -24.6,0.775 -23.65,3.9
3D body: height 2.5, standoff 2, extent -22.06,0.775 -21.11,3.9
3D body: height 2.5, standoff 2, extent -19.52,0.775 -18.57,3.9
3D body: height 2.5, standoff 2, extent -16.98,0.775 -16.03,3.9
3D body: height 2.5, standoff 2, extent -14.44,0.775 -13.49,3.9
3D body: height 2.5, standoff 2, extent -11.9,0.775 -10.95,3.9
3D body: height 2.5, standoff 2, extent -9.36,0.775 -8.41,3.9
3D body: height 2.5, standoff 2, extent -6.82,0.775 -5.87,3.9
3D body: height 2.5, standoff 2, extent -4.28,0.775 -3.33,3.9
3D body: height 2.5, standoff 2, extent -1.74,0.775 -0.79,3.9
3D body: height 2.5, standoff 2, extent 0.8,0.775 1.75,3.9
3D body: height 2.5, standoff 2, extent 3.34,0.775 4.29,3.9
3D body: height 2.5, standoff 2, extent 5.88,0.775 6.83,3.9
3D body: height 2.5, standoff 2, extent 8.42,0.775 9.37,3.9
3D body: height 2.5, standoff 2, extent 10.96,0.775 11.91,3.9
3D body: height 2.5, standoff 2, extent 13.5,0.775 14.45,3.9
3D body: height 2.5, standoff 2, extent 16.04,0.775 16.99,3.9
3D body: height 2.5, standoff 2, extent 18.58,0.775 19.53,3.9
3D body: height 2.5, standoff 2, extent 21.12,0.775 22.07,3.9
3D body: height 2.5, standoff 2, extent 23.66,0.775 24.61,3.9
3D body: height 4.5, standoff 4, extent -24.6,-1.765 -23.65,3.9
3D body: height 4.5, standoff 4, extent -22.06,-1.765 -21.11,3.9
3D body: height 4.5, standoff 4, extent -19.52,-1.765 -18.57,3.9
3D body: height 4.5, standoff 4, extent -16.98,-1.765 -16.03,3.9
3D body: height 4.5, standoff 4, extent -14.44,-1.765 -13.49,3.9
3D body: height 4.5, standoff 4, extent -11.9,-1.765 -10.95,3.9
3D body: height 4.5, standoff 4, extent -9.36,-1.765 -8.41,3.9
3D body: height 4.5, standoff 4, extent -6.82,-1.765 -5.87,3.9
3D body: height 4.5, standoff 4, extent -4.28,-1.765 -3.33,3.9
3D body: height 4.5, standoff 4, extent -1.74,-1.765 -0.79,3.9
3D body: height 4.5, standoff 4, extent 0.8,-1.765 1.75,3.9
3D body: height 4.5, standoff 4, extent 3.34,-1.765 4.29,3.9
3D body: height 4.5, standoff 4, extent 5.88,-1.765 6.83,3.9
3D body: height 4.5, standoff 4, extent 8.42,-1.765 9.37,3.9
3D body: height 4.5, standoff 4, extent 10.96,-1.765 11.91,3.9
3D body: height 4.5, standoff 4, extent 13.5,-1.765 14.45,3.9
3D body: height 4.5, standoff 4, extent 16.04,-1.765 16.99,3.9
3D body: height 4.5, standoff 4, extent 18.58,-1.765 19.53,3.9
3D body: height 4.5, standoff 4, extent 21.12,-1.765 22.07,3.9
3D body: height 4.5, standoff 4, extent 23.66,-1.765 24.61,3.9
3D body: height 4, standoff -3, extent 11.06,-1.6 11.76,-0.9
3D body: height 4, standoff -3, extent 13.6,-1.6 14.3,-0.9
3D body: height 4, standoff -3, extent 16.14,-1.6 16.84,-0.9
3D body: height 4, standoff -3, extent 18.68,-1.6 19.38,-0.9
3D body: height 4, standoff -3, extent 21.22,-1.6 21.92,-0.9
3D body: height 4, standoff -3, extent 23.76,-1.6 24.46,-0.9